# Altium footprint library ACTION_Others.pcblib: 88 footprints (part 6 of 6)
Each footprint in its own frame and in the unit in brackets; x right, y up, seen from the top. Pads: shape width x height; smd on the part's side, far side on the other; paste and mask are expansions set on the pad; w line width, h text height; cw(c..) or ccw(c..) is an arc to the next point about the centre after c.
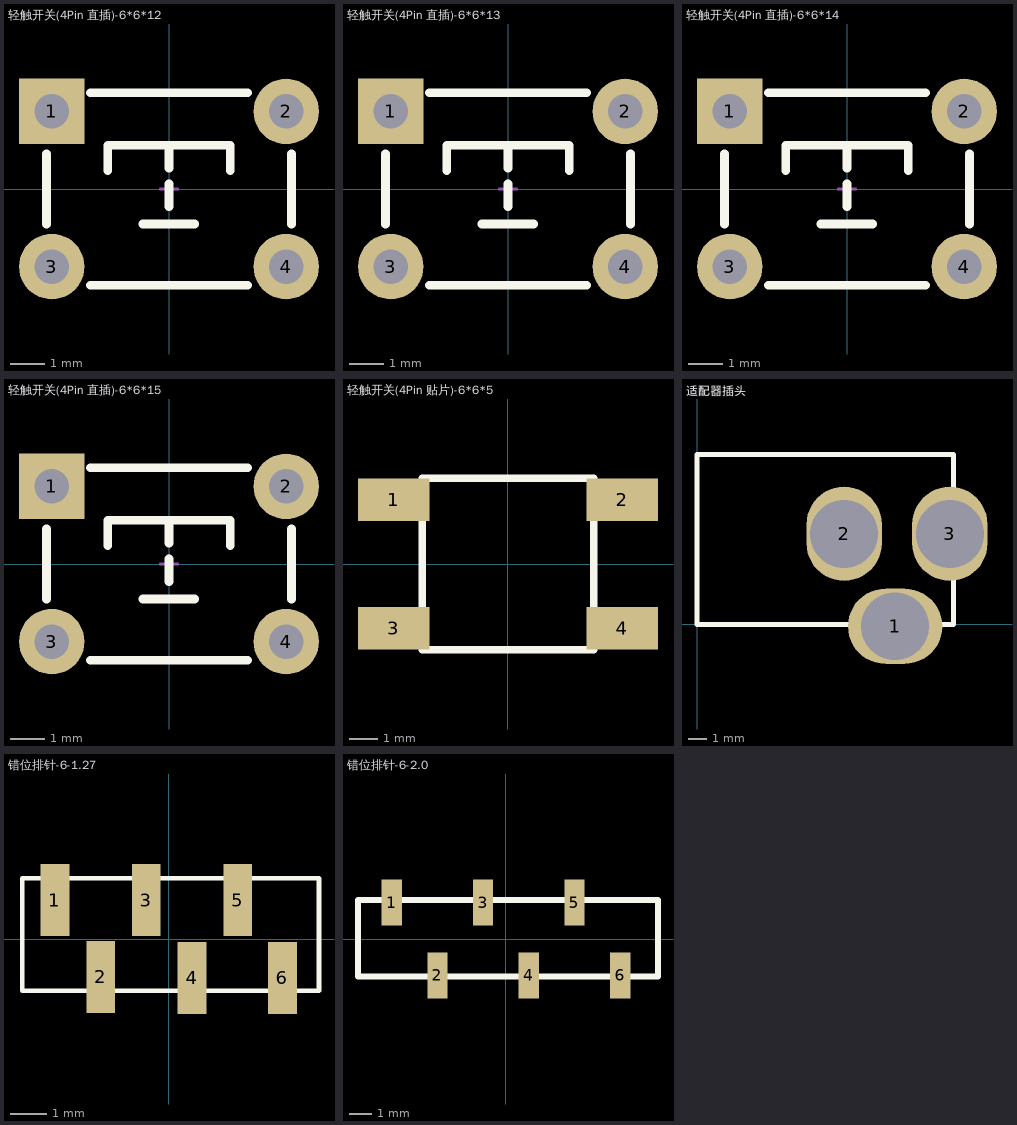
[diagram p5: the footprints below, top view; thin cyan lines are the x and y axes]

## 轻触开关(4Pin 直插)-6*6*12 [mm] "6*6*12mm"
height 12
pads (4):
  rect 1.9x1.9 hole 1: 1(-3.4,2.25)
  round 1.9 hole 1: 2(3.4,2.25) 3(-3.4,-2.25) 4(3.4,-2.25)
Top Overlay:
  lines w0.254: -3.556,-1.016 -3.556,1.016 ; -2.286,-2.794 2.286,-2.794 ; -2.286,2.794 2.286,2.794 ; -1.778,0.533 -1.778,1.27 1.778,1.27 1.778,0.533 ; -0.762,-1.016 0.737,-1.016 ; 0,-0.508 0,0.152 ; 0,0.61 0,1.27 ; 3.556,-1.016 3.556,1.016
Mechanical 15:
  lines w0.076: -0.254,0 0.254,0 ; 0,-0.254 0,0.254
3D body "TSW DIP-6x6x12.STEP": height 11.95, standoff -3.45, extent -4.106,-3 4.106,3

## 轻触开关(4Pin 直插)-6*6*13 [mm] "6*6*13mm"
height 13
pads (4):
  rect 1.9x1.9 hole 1: 1(-3.4,2.25)
  round 1.9 hole 1: 2(3.4,2.25) 3(-3.4,-2.25) 4(3.4,-2.25)
Top Overlay:
  lines w0.254: -3.556,-1.016 -3.556,1.016 ; -2.286,-2.794 2.286,-2.794 ; -2.286,2.794 2.286,2.794 ; -1.778,0.533 -1.778,1.27 1.778,1.27 1.778,0.533 ; -0.762,-1.016 0.737,-1.016 ; 0,-0.508 0,0.152 ; 0,0.61 0,1.27 ; 3.556,-1.016 3.556,1.016
Mechanical 15:
  lines w0.076: -0.254,0 0.254,0 ; 0,-0.254 0,0.254
3D body "TSW DIP-6x6x13.STEP": height 12.95, standoff -3.45, extent -4.106,-3 4.106,3

## 轻触开关(4Pin 直插)-6*6*14 [mm] "6*6*14mm"
height 14
pads (4):
  rect 1.9x1.9 hole 1: 1(-3.4,2.25)
  round 1.9 hole 1: 2(3.4,2.25) 3(-3.4,-2.25) 4(3.4,-2.25)
Top Overlay:
  lines w0.254: -3.556,-1.016 -3.556,1.016 ; -2.286,-2.794 2.286,-2.794 ; -2.286,2.794 2.286,2.794 ; -1.778,0.533 -1.778,1.27 1.778,1.27 1.778,0.533 ; -0.762,-1.016 0.737,-1.016 ; 0,-0.508 0,0.152 ; 0,0.61 0,1.27 ; 3.556,-1.016 3.556,1.016
Mechanical 15:
  lines w0.076: -0.254,0 0.254,0 ; 0,-0.254 0,0.254
3D body "TSW DIP-6x6x14.STEP": height 13.95, standoff -3.45, extent -4.106,-3 4.106,3

## 轻触开关(4Pin 直插)-6*6*15 [mm] "6*6*15mm"
height 15
pads (4):
  rect 1.9x1.9 hole 1: 1(-3.4,2.25)
  round 1.9 hole 1: 2(3.4,2.25) 3(-3.4,-2.25) 4(3.4,-2.25)
Top Overlay:
  lines w0.254: -3.556,-1.016 -3.556,1.016 ; -2.286,-2.794 2.286,-2.794 ; -2.286,2.794 2.286,2.794 ; -1.778,0.533 -1.778,1.27 1.778,1.27 1.778,0.533 ; -0.762,-1.016 0.737,-1.016 ; 0,-0.508 0,0.152 ; 0,0.61 0,1.27 ; 3.556,-1.016 3.556,1.016
Mechanical 15:
  lines w0.076: -0.254,0 0.254,0 ; 0,-0.254 0,0.254
3D body "TSW DIP-6x6x15.STEP": height 14.95, standoff -3.45, extent -4.106,-3 4.106,3

## 轻触开关(4Pin 贴片)-6*6*5 [mm]
pads (4):
  rect 2.5x1.5 smd: 1(-4,2.25) 2(4,2.25) 3(-4,-2.25) 4(4,-2.25)
Top Overlay:
  lines w0.254: -3,-3 -3,3 3,3 3,-3 -3,-3
3D body "TSW DIP-6x6x11.STEP": height 10.95, standoff -3.45, extent -4.106,-3 4.106,3

## 适配器插头 [mm]
pads (3):
  oval 5x4 hole 3.6: 1(10.5,-0.1)
  oval 4x5 hole 3.6: 2(7.8,4.8) 3(13.4,4.8)
Top Overlay:
  lines w0.254: 13.6,8.4 13.6,9 12.4,9 0,9 0,0 13.6,0 13.6,8.5
3D body "User Library-dc range - dc connector[4840_2201].step": height 11, standoff -3.5, extent -0.081,-0.229 13.746,9.277

## 错位排针-6-1.27 [mm]
pads (6):
  rect 0.8x2 smd: 1(-3.162,1.079) 2(-1.892,-1.054) 3(-0.622,1.079) 4(0.648,-1.079) 5(1.918,1.079) 6(3.162,-1.079)
Top Overlay:
  lines w0.127: -4.077,1.689 -4.077,-1.435 4.178,-1.435 4.178,1.689 -4.051,1.689

## 错位排针-6-2.0 [mm]
pads (6):
  rect 0.89x2 smd: 1(-5.002,1.595) 2(-2.998,-1.595) 3(-1.002,1.595) 4(1.002,-1.595) 5(2.998,1.595) 6(5.002,-1.595)
Top Overlay:
  lines w0.254: -5.637,1.707 -6.475,1.707 -6.475,-1.646 6.657,-1.646 6.657,1.707 -5.561,1.707